# Altium footprint library BARKO_PCBLIB.PcbLib: 531 footprints (part 24 of 34)
Each footprint in its own frame and in the unit in brackets; x right, y up, seen from the top. Pads: shape width x height; smd on the part's side, far side on the other; paste and mask are expansions set on the pad; w line width, h text height; cw(c..) or ccw(c..) is an arc to the next point about the centre after c.
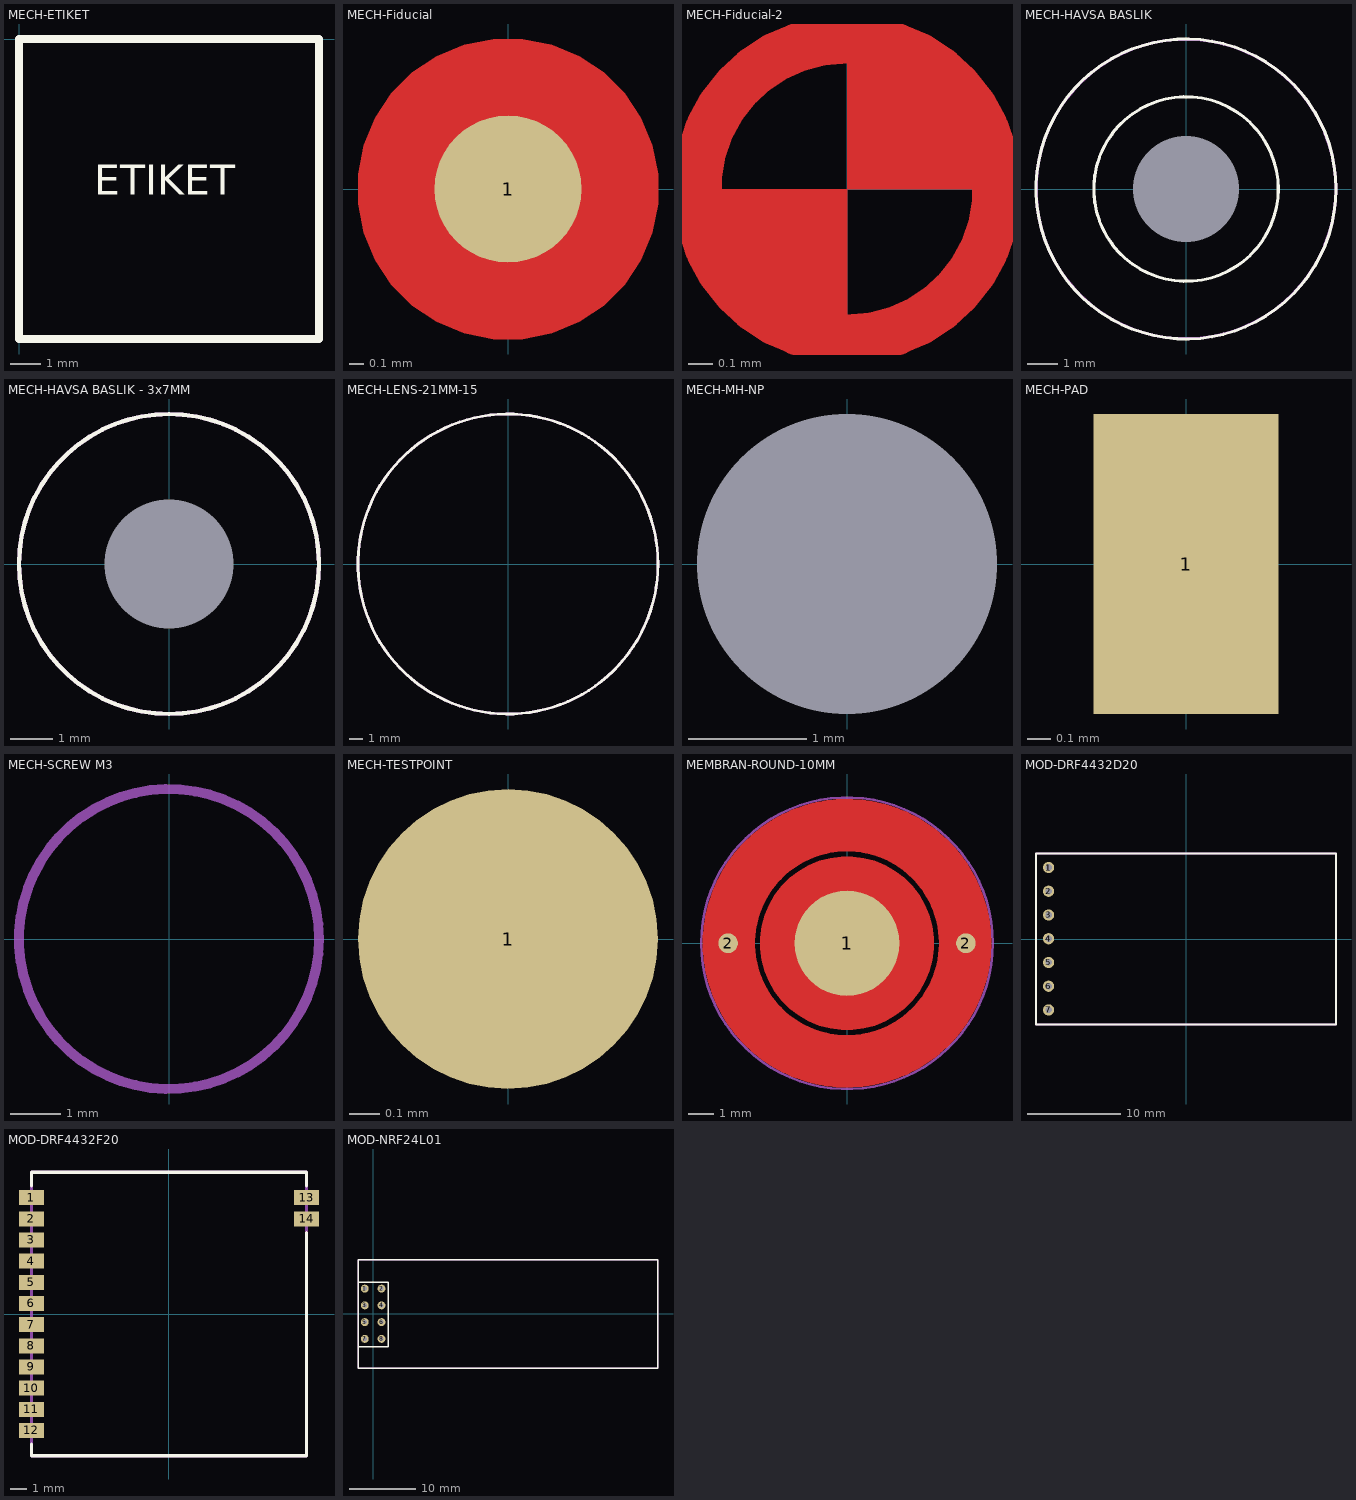
[diagram p23: the footprints below, top view; thin cyan lines are the x and y axes]

## MECH-ETIKET [mm]
Top Overlay:
  lines w0.254: 0,0 10,0 10,-10 0,-10 0,-0.038 0.038,0
  text "ETIKET" at 2.5,-5.2 h1

## MECH-Fiducial [mm]
pads (1):
  round 1 smd mask+0.5: 1(0,0)
Top Layer:
  pour cut-out: 0,-1.02 -0.1,-1.02 -0.297,-0.981 -0.483,-0.904 -0.65,-0.792 -0.792,-0.65 -0.904,-0.483 -0.981,-0.297 -1.02,-0.1 -1.02,0 -1.02,0.1 -0.981,0.297 -0.904,0.483 -0.792,0.65 -0.65,0.792 -0.483,0.904 -0.297,0.981 -0.1,1.02 0,1.02 0.1,1.02 0.297,0.981 0.483,0.904 0.65,0.792 0.792,0.65 0.904,0.483 0.981,0.297 1.02,0.1 1.02,0 1.02,-0.1 0.981,-0.297 0.904,-0.483 0.792,-0.65 0.65,-0.792 0.483,-0.904 0.297,-0.981 0.1,-1.02

## MECH-Fiducial-2 [mm] "Fiducial"
Top Layer:
  region: 0,-0.625 -0.375,-0.5 -0.625,-0.25 -0.625,0 0,0
  region: 0.625,0 0,0 0,0.625 0.375,0.5 0.625,0.25
  lines w0.203: 0,-0.625 ccw(c0,0) 0,0.625 ccw(c0,0) 0,-0.625
Top Solder:
  circle w0.203: c0,0 r0.625
  region: 0.625,0 0.5,-0.375 0.25,-0.625 -0.25,-0.625 -0.5,-0.375 -0.625,0 -0.5,0.375 -0.375,0.5 0,0.625 0.375,0.5 0.5,0.25 0.5,0.375 0.375,0.5

## MECH-HAVSA BASLIK [mil]
pads (1):
  round 1 hole 137.8 unplated: 1(0,0)
Top Overlay:
  circle w4: c0,0 r195.26
  circle w4: c0,0 r120.1
ASM Top:
  circle w4: c0,0 r195
  text ".designator" at -154,-22 h31.5

## MECH-HAVSA BASLIK - 3x7MM [mil]
pads (1):
  round 1 hole 118.11 unplated: 1(0,0)
Top Overlay:
  circle w4: c0,0 r137.8
ASM Top:
  circle w4: c0,0 r137.8
  text ".designator" at -154,-22 h31.5

## MECH-HEMSIRE PANELI [mm]
3D body "panel_2.17.stp": height 4.34, standoff -51.4, extent -98.056,-186.496 105.32,96.118

## MECH-LENS-21MM-15 [mm]
height 14.28
Top Overlay:
  circle w0.2: c0,0 r10.8
ASM Top:
  circle w0.2: c0,0 r10.8
  text ".designator" at 0,0 h0.8
3D body "IRENE-Assy_Mech 20121115_pv.stp": height 14.29, standoff -1.28, extent -10.78,-10.78 10.78,10.78

## MECH-MH-NP [mm]
pads (1):
  round 0 hole 2.54 unplated: 1(0,0)

## MECH-PAD [mm]
pads (1):
  rect 0.8x1.3 smd: 1(0,0)

## MECH-PCBCODE [mm]
Top Overlay:
  text ".PCBCODE" at 0,0 h1.5

## MECH-SCREW M3 [mm] "YSB"
height 5
ASM Top:
  circle w0.2: c0,0 r3
  text ".designator" at -0.686,-0.229 h0.8
3D body "M3_YSB.STEP": height 2.37, standoff -4.99, extent -2.8,-2.8 2.803,2.8

## MECH-TESTPOINT [mm]
pads (1):
  round 1 smd paste-2 mask+0.1: 1(0,0)

## MEMBRAN-ROUND-10MM [mil]
pads (3):
  round 160 smd paste-100: 1(0,0)
  round 30 smd paste-100 mask+0: 2(-181.1,0) 2(181.1,0)
Top Layer:
  circle w80: c0,0 r180
  pour cut-out: 0,-132.05 -8.65,-132.05 -25.82,-129.79 -42.54,-125.31 -58.53,-118.69 -73.52,-110.03 -87.25,-99.49 -99.49,-87.25 -110.03,-73.52 -118.69,-58.53 -125.31,-42.54 -129.79,-25.82 -132.05,-8.65 -132.05,0 -132.05,8.65 -129.79,25.82 -125.31,42.54 -118.69,58.53 -110.03,73.52 -99.49,87.25 -87.25,99.49 -73.52,110.03 -58.53,118.69 -42.54,125.31 -25.82,129.79 -8.65,132.05 0,132.05 8.65,132.05 25.82,129.79 42.54,125.31 58.53,118.69 73.52,110.03 87.25,99.49 99.49,87.25 110.03,73.52 118.69,58.53 125.31,42.54 129.79,25.82 132.05,8.65 132.05,0 132.05,-8.65 129.79,-25.82 125.31,-42.54 118.69,-58.53 110.03,-73.52 99.49,-87.25 87.25,-99.49 73.52,-110.03 58.53,-118.69 42.54,-125.31 25.82,-129.79 8.65,-132.05
  pour cut-out: -177.17,157.48
  pour cut-out: 0,0
  pour cut-out: 199,-131
  region: -4,140
  region: -4,140
ASM Top:
  circle w4: c0,0 r222.04
  pour cut-out: -221,235

## MOD-DRF4432D20 [mm]
pads (8):
  round 1.2 hole 0.7 mask+0.05: 1(-14.7,7.65) 1(-14.7,7.65) 2(-14.7,5.11) 3(-14.7,2.57) 4(-14.7,0.03) 5(-14.7,-2.51) 6(-14.7,-5.05) 7(-14.7,-7.59)
Top Overlay:
  lines w0.2: -16.05,-9.15 16.05,-9.15 16.05,9.15 -16.05,9.15 -16.05,-9.15
ASM Top:
  lines w0.2: -16.05,-9.15 16.05,-9.15 16.05,9.15 -16.05,9.15 -16.05,-9.15
  text ".designator" at -2.4,-0.3 h0.8
3D body: height 7, standoff 0, extent -16.05,-9.15 16.1,9.15

## MOD-DRF4432F20 [mm]
pads (14):
  rect 1.5x0.9 smd mask+0.05: 1(-8.25,6.985) 2(-8.25,5.715) 3(-8.25,4.445) 4(-8.25,3.175) 5(-8.25,1.905) 6(-8.25,0.635) 7(-8.25,-0.635) 8(-8.25,-1.905) 9(-8.25,-3.175) 10(-8.25,-4.445) 11(-8.25,-5.715) 12(-8.25,-6.985) 13(8.25,6.985) 14(8.25,5.715)
Top Overlay:
  lines w0.2: 8.25,4.895 8.25,-8.5 -8.25,-8.5 -8.25,-7.8 ; 8.25,7.7 8.25,8.5 -8.25,8.5 -8.25,7.7 ; -8.25,-7.8 -8.25,-7.8 ; -8.25,7.7 -8.25,7.7
ASM Top:
  lines w0.2: -8.25,-8.5 8.25,-8.5 8.25,8.5 -8.25,8.5 -8.25,-8.5
  text ".designator" at -1.3,0 h0.8
3D body "User Library-DRF4432F20.step": height 2.01, standoff 0.01, extent -8.25,-8.5 8.25,8.5

## MOD-NRF24L01 [mm]
pads (8):
  round 1.2 hole 0.6 mask+0.05: 1(-1.27,3.81) 2(1.27,3.81) 3(-1.27,1.27) 4(1.27,1.27) 5(-1.27,-1.27) 6(1.27,-1.27) 7(-1.27,-3.81) 8(1.27,-3.81)
Top Overlay:
  lines w0.2: -2.3,-1.27 -2.3,-8.29 43.2,-8.29 43.2,8.21 -2.3,8.21 -2.3,3.81 ; -2.3,-5 -2.3,4.8 2.3,4.8 2.3,-5 -2.3,-5
ASM Top:
  lines w0.2: -2.3,-8.29 -2.3,8.21 43.2,8.21 43.2,-8.29 -2.3,-8.29
  text ".designator" at 19.2,-0.5 h0.8